# Altium footprint library TarabusLib_KOR.PcbLib: 560 footprints (part 34 of 35)
Each footprint in its own frame and in the unit in brackets; x right, y up, seen from the top. Pads: shape width x height; smd on the part's side, far side on the other; paste and mask are expansions set on the pad; w line width, h text height; cw(c..) or ccw(c..) is an arc to the next point about the centre after c.
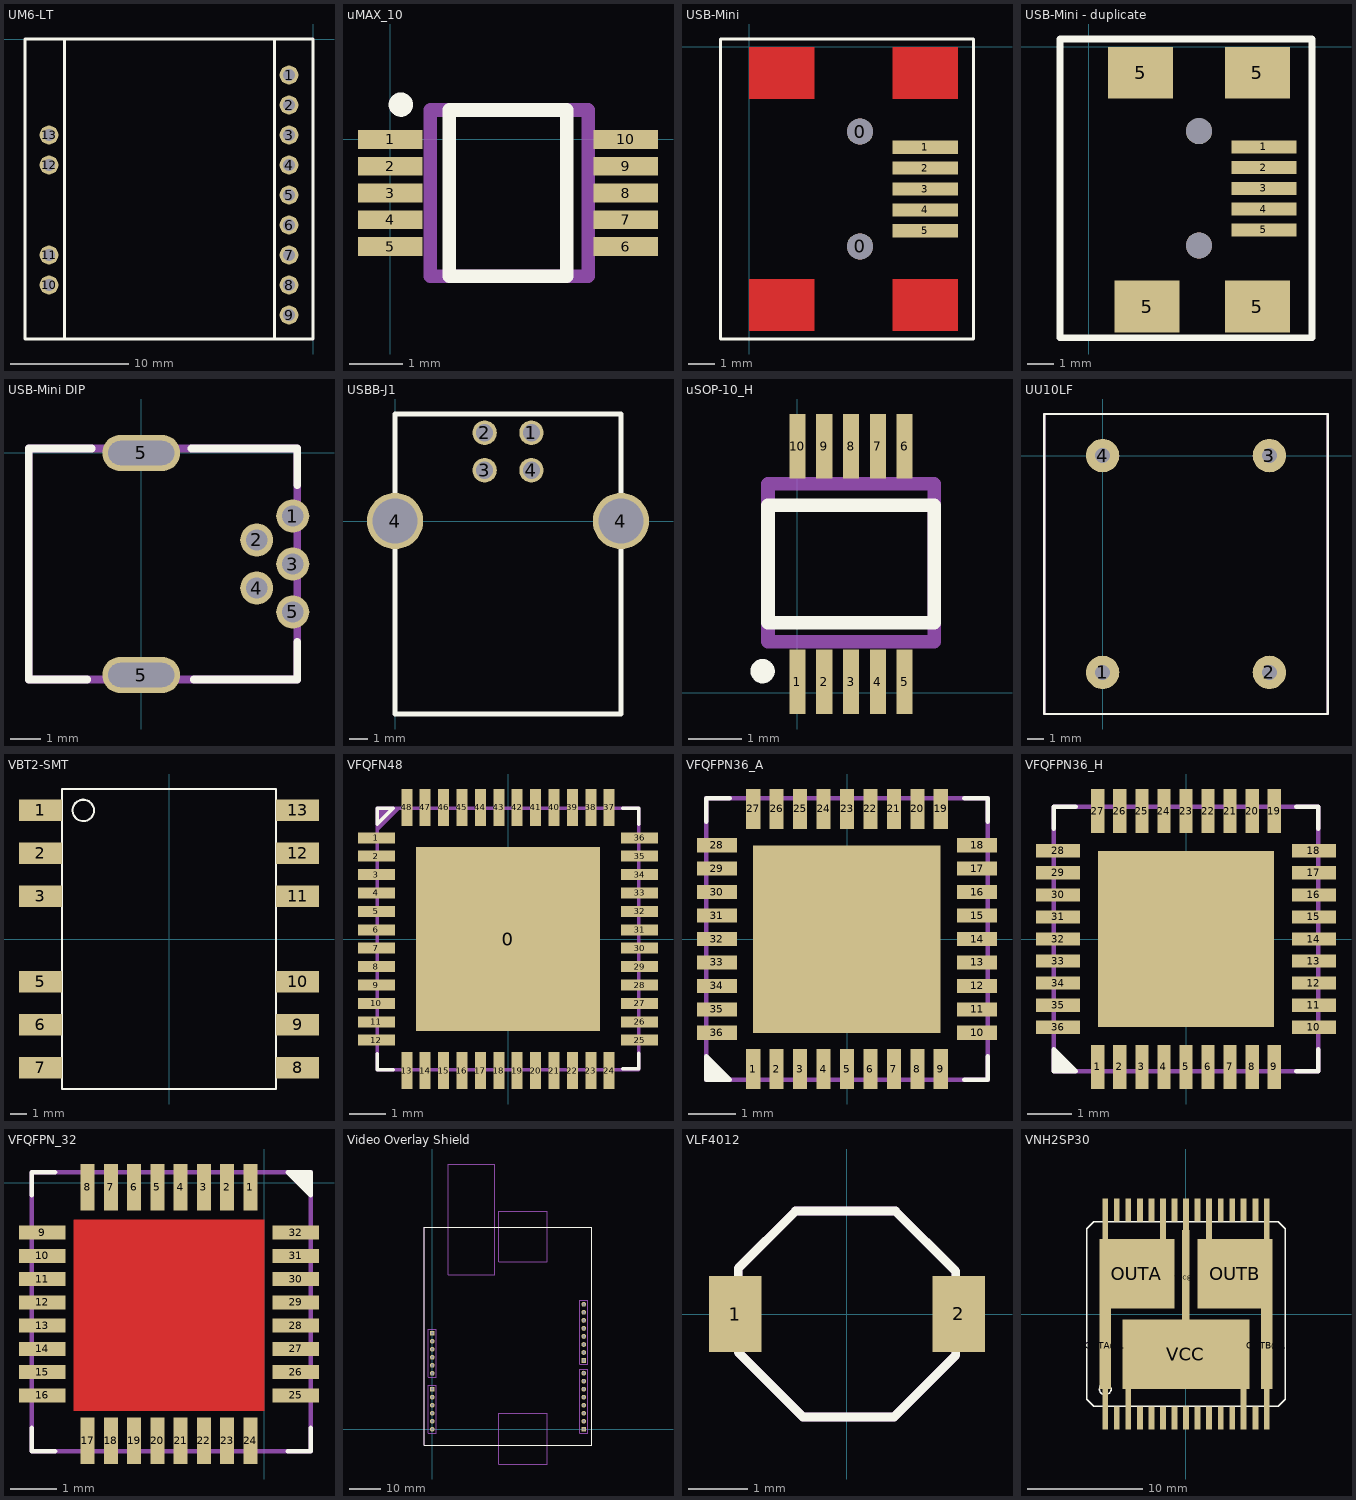
[diagram p33: the footprints below, top view; thin cyan lines are the x and y axes]

## UM6-LT [mm]
pads (13):
  round 1.6 hole 1 mask+0: 1(-2.032,-3.048) 2(-2.032,-5.588) 3(-2.032,-8.128) 4(-2.032,-10.668) 5(-2.032,-13.208) 6(-2.032,-15.748) 7(-2.032,-18.288) 8(-2.032,-20.828) 9(-2.032,-23.368) 10(-22.352,-20.828) 11(-22.352,-18.288) 12(-22.352,-10.668) 13(-22.352,-8.128)
Top Overlay:
  lines w0.254: -21.05,-25.4 -21.05,0 ; -3.27,-25.4 -3.27,0 ; -24.384,-25.4 0,-25.4 0,0 -24.384,0 -24.384,-25.4
3D body: height 8, standoff 2, extent -24.384,-25.4 0,0

## uMAX_10 [mm]
pads (10):
  rect 1.2x0.35 smd mask+0: 1(0,0) 2(0,-0.5) 3(0,-1) 4(0,-1.5) 5(0,-2) 6(4.4,-2) 7(4.4,-1.5) 8(4.4,-1) 9(4.4,-0.5) 10(4.4,0)
Top Overlay:
  circle w0.254: c0.2,0.65 r0.1
  lines w0.254: 1.1,-2.55 1.1,0.55 3.3,0.55 3.3,-2.55 1.1,-2.55
Mechanical 7:
  lines w0.254: 0.75,-2.55 0.75,0.55 ; 0.8,-2.55 3.7,-2.55 3.7,0.55 0.8,0.55
3D body "SW3dPS-uMAX10.STEP": height 0.95, standoff 0, extent -0.3,-2.5 4.7,0.5

## USB-Mini [mm]
pads (7):
  round 1 hole 1 mask+0: 0(4.25,-7.65) 0(4.25,-3.25)
  rect 2.5x0.5 smd: 1(6.75,-3.85) 2(6.75,-4.65) 3(6.75,-5.45) 4(6.75,-6.25) 5(6.75,-7.05)
Top Layer:
  rectangle: 0,-10.9 2.5,-8.9
  rectangle: 0,-2 2.5,0
  rectangle: 5.5,-10.9 8,-8.9
  rectangle: 5.5,-2 8,0
Top Overlay:
  lines w0.1: -1.1,-11.2 8.6,-11.2 8.6,0.3 -1.1,0.3 -1.1,-11.2
3D body "User Library-usb_mini_smd.STEP": height 4.14, standoff -0.95, extent -1.7,-10.4 7.5,-0.5

## USB-Mini - duplicate [mm]
height 2
pads (11):
  rect 2.5x0.5 smd: 1(6.75,-3.85) 2(6.75,-4.65) 3(6.75,-5.45) 4(6.75,-6.25) 5(6.75,-7.05)
  rect 2.5x2 smd: 5(2,-1) 5(2.25,-10) 5(6.5,-10) 5(6.5,-1)
  round 1 hole 1 mask+0: ""(4.25,-7.65)
  round 1 hole 1 unplated mask+0: ""(4.25,-3.25)
Top Overlay:
  lines w0.254: -1.1,-11.2 -1.1,0.3 8.6,0.3 8.6,-11.2 -1.1,-11.2
3D body "miniusbfm.step": height 3.9, standoff -0.05, extent -1.825,-10.45 7.175,-0.55

## USB-Mini DIP [mm]
height 3.9
pads (7):
  round 1.1 hole 0.7: 1(5.05,-2.1) 2(3.85,-2.9) 3(5.05,-3.7) 4(3.85,-4.5) 5(5.05,-5.3)
  oval 2.6x1.2 hole 0.8 slot 2.2 at 0 deg: 5(0,-7.4) 5(0,0)
Top Overlay:
  lines w0.254: -1.8,-7.55 -3.75,-7.55 -3.75,0.15 -1.65,0.15 ; 1.675,0.15 5.2,0.15 5.2,-1.075 ; 1.75,-7.55 5.2,-7.55 5.2,-6.3
Mechanical 7:
  lines w0.254: -3.75,-7.55 -3.75,0.15 5.2,0.15 5.2,-7.55 -3.75,-7.55
3D body: height 3.9, standoff 0, extent -3.749,-7.549 5.199,0.149

## USBB-J1 [mm]
pads (6):
  round 1.3 hole 0.92: 1(7.27,4.71) 2(4.77,4.71) 3(4.77,2.71) 4(7.27,2.71)
  round 3 hole 2.4: 4(0,0) 4(12.04,0)
Top Overlay:
  lines w0.254: 12,5.71 0,5.71 0,-10.29 12.04,-10.29 12.04,5.71
3D body "User Library-Samtec - USB-B-S-X-W-TH.STEP": height 11, standoff -3.64, extent -1.398,-10.3 13.398,6.2

## uSOP-10_H [mm]
pads (10):
  rect 0.3x1.2 smd mask+0: 1(0,0.2) 2(0.5,0.2) 3(1,0.2) 4(1.5,0.2) 5(2,0.2) 6(2,4.6) 7(1.5,4.6) 8(1,4.6) 9(0.5,4.6) 10(0,4.6)
Top Overlay:
  circle w0.254: c-0.65,0.4 r0.1
  lines w0.254: -0.55,1.3 2.55,1.3 2.55,3.5 -0.55,3.5 -0.55,1.3
Mechanical 9:
  text ".Comment" at 3.25,1 h0.6
  text ".Designator" at -1,1 h0.8
Mechanical 11:
  lines w0.254: -0.55,0.95 2.55,0.95 ; -0.55,1 -0.55,3.9 2.55,3.9 2.55,1
3D body "User Library-msop-10.STEP": height 1.15, standoff 0, extent -0.5,-0.05 2.5,4.85

## UU10LF [mm]
pads (4):
  round 2 hole 0.9: 1(0,-13) 2(10,-13) 3(10,0) 4(0,0)
Top Overlay:
  lines w0.15: -3.5,-15.5 -3.5,2.5 13.5,2.5 13.5,-15.5 -3.5,-15.5
Mechanical 7:
  lines w0.15: -3.5,-15.5 13.5,-15.5 13.5,2.5 -3.5,2.5 -3.5,-15.5
Mechanical 10:
  text ".Comment" at 9,3.5 h0.6
  text ".Designator" at 8.8,4.425 h0.8
3D body: height 23, standoff 0, extent -3.5,-15.5 13.5,2.5

## VBT2-SMT [mm]
pads (12):
  rect 2.54x1.27 smd: 1(-7.62,7.62) 2(-7.62,5.08) 3(-7.62,2.54) 5(-7.62,-2.54) 6(-7.62,-5.08) 7(-7.62,-7.62) 8(7.62,-7.62) 9(7.62,-5.08) 10(7.62,-2.54) 11(7.62,2.54) 12(7.62,5.08) 13(7.62,7.62)
Top Overlay:
  circle w0.127: c-5.08,7.62 r0.635
  lines w0.127: -6.35,-8.89 -6.35,8.89 6.35,8.89 6.35,-8.89 -6.35,-8.89

## VFQFN48 [mm]
height 1
pads (49):
  rect 5x5 smd: 0(0,0)
  rect 1x0.3 smd: 1(-3.575,2.75) 2(-3.575,2.25) 3(-3.575,1.75) 4(-3.575,1.25) 5(-3.575,0.75) 6(-3.575,0.25) 7(-3.575,-0.25) 8(-3.575,-0.75) 9(-3.575,-1.25) 10(-3.575,-1.75) 11(-3.575,-2.25) 12(-3.575,-2.75) 25(3.575,-2.75) 26(3.575,-2.25) 27(3.575,-1.75) 28(3.575,-1.25) 29(3.575,-0.75) 30(3.575,-0.25) 31(3.575,0.25) 32(3.575,0.75) 33(3.575,1.25) 34(3.575,1.75) 35(3.575,2.25) 36(3.575,2.75)
  rect 0.3x1 smd: 13(-2.75,-3.575) 14(-2.25,-3.575) 15(-1.75,-3.575) 16(-1.25,-3.575) 17(-0.75,-3.575) 18(-0.25,-3.575) 19(0.25,-3.575) 20(0.75,-3.575) 21(1.25,-3.575) 22(1.75,-3.575) 23(2.25,-3.575) 24(2.75,-3.575) 37(2.75,3.575) 38(2.25,3.575) 39(1.75,3.575) 40(1.25,3.575) 41(0.75,3.575) 42(0.25,3.575) 43(-0.25,3.575) 44(-0.75,3.575) 45(-1.25,3.575) 46(-1.75,3.575) 47(-2.25,3.575) 48(-2.75,3.575)
Top Overlay:
  lines w0.1: -3.55,-3.125 -3.55,-3.55 -3.125,-3.55 ; 3.125,-3.525 3.55,-3.525 3.55,-3.1 ; 3.125,3.55 3.55,3.55 3.55,3.125 ; -3.55,3.125 -3.125,3.55 -3.55,3.55 -3.55,3.125
Mechanical 9:
  text ".Designator" at -1.225,-4.925 h0.6
  text ".Comment" at -1.275,4.375 h0.6
Mechanical 11:
  lines w0.1: -3.546,2.979 -2.987,3.538 ; -3.542,3.108 -3.1,3.55 ; -3.542,3.208 -3.213,3.537 ; -3.542,3.396 -3.4,3.537 -3.375,3.512 ; -3.517,3.333 -3.338,3.512 ; -3.55,-3.55 3.55,-3.55 3.55,3.55 -3.55,3.55 -3.55,-3.55
3D body "UFQFPN48.STEP": height 0.55, standoff -0.02, extent -3.505,-3.5 3.505,3.51

## VFQFPN36_A [mm]
height 1
pads (37):
  rect 0.3x0.85 smd mask+0: 1(-2,-2.775) 2(-1.5,-2.775) 3(-1,-2.775) 4(-0.5,-2.775) 5(0,-2.775) 6(0.5,-2.775) 7(1,-2.775) 8(1.5,-2.775) 9(2,-2.775) 19(2,2.775) 20(1.5,2.775) 21(1,2.775) 22(0.5,2.775) 23(0,2.775) 24(-0.5,2.775) 25(-1,2.775) 26(-1.5,2.775) 27(-2,2.775)
  rect 0.85x0.3 smd mask+0: 10(2.775,-2) 11(2.775,-1.5) 12(2.775,-1) 13(2.775,-0.5) 14(2.775,0) 15(2.775,0.5) 16(2.775,1) 17(2.775,1.5) 18(2.775,2) 28(-2.775,2) 29(-2.775,1.5) 30(-2.775,1) 31(-2.775,0.5) 32(-2.775,0) 33(-2.775,-0.5) 34(-2.775,-1) 35(-2.775,-1.5) 36(-2.775,-2)
  rect 4x4 smd: ""(0,0)
Top Overlay:
  region: -3,-3 -2.5,-3 -3,-2.5
  lines w0.1: -3,2.5 -3,3 -2.5,3 ; 2.5,-3 3,-3 3,-2.5 ; 2.5,3 3,3 3,2.5 ; -3,-3 -2.5,-3 -3,-2.5 -3,-3
Mechanical 9:
  text ".Designator" at -1.075,3.6 h0.8
  text ".Comment" at -1,-3.875 h0.6
Mechanical 11:
  lines w0.1: -3,-3 -3,3 3,3 3,-3 -3,-3
3D body "VFQFPN36.STEP": height 0.9, standoff -0.02, extent -3.03,-3.005 2.98,3.005

## VFQFPN36_H [mm]
height 1
pads (37):
  rect 0.3x1 smd mask+0: 1(-2,-2.9) 2(-1.5,-2.9) 3(-1,-2.9) 4(-0.5,-2.9) 5(0,-2.9) 6(0.5,-2.9) 7(1,-2.9) 8(1.5,-2.9) 9(2,-2.9) 19(2,2.9) 20(1.5,2.9) 21(1,2.9) 22(0.5,2.9) 23(0,2.9) 24(-0.5,2.9) 25(-1,2.9) 26(-1.5,2.9) 27(-2,2.9)
  rect 1x0.3 smd mask+0: 10(2.9,-2) 11(2.9,-1.5) 12(2.9,-1) 13(2.9,-0.5) 14(2.9,0) 15(2.9,0.5) 16(2.9,1) 17(2.9,1.5) 18(2.9,2) 28(-2.9,2) 29(-2.9,1.5) 30(-2.9,1) 31(-2.9,0.5) 32(-2.9,0) 33(-2.9,-0.5) 34(-2.9,-1) 35(-2.9,-1.5) 36(-2.9,-2)
  rect 4x4 smd: ""(0,0)
Top Overlay:
  region: -3,-3 -2.5,-3 -3,-2.5
  lines w0.1: -3,2.5 -3,3 -2.5,3 ; 2.5,-3 3,-3 3,-2.5 ; 2.5,3 3,3 3,2.5 ; -3,-3 -3,-2.5 -2.5,-3 -3,-3
Mechanical 7:
  lines w0.1: -3,-3 3,-3 3,3 -3,3 -3,-3
Mechanical 10:
  text ".Comment" at -1,-3.875 h0.6
  text ".Designator" at -1.05,3.6 h0.8
3D body: height 1, standoff 0, extent -3,-3 3,3

## VFQFPN_32 [mm]
pads (32):
  rect 0.3x1 smd mask+0: 1(-0.3,-0.1) 2(-0.8,-0.1) 3(-1.3,-0.1) 4(-1.8,-0.1) 5(-2.3,-0.1) 6(-2.8,-0.1) 7(-3.3,-0.1) 8(-3.8,-0.1) 17(-3.8,-5.55) 18(-3.3,-5.55) 19(-2.8,-5.55) 20(-2.3,-5.55) 21(-1.8,-5.55) 22(-1.3,-5.55) 23(-0.8,-5.55) 24(-0.3,-5.55)
  rect 1x0.3 smd mask+0: 9(-4.775,-1.075) 10(-4.775,-1.575) 11(-4.775,-2.075) 12(-4.775,-2.575) 13(-4.775,-3.075) 14(-4.775,-3.575) 15(-4.775,-4.075) 16(-4.775,-4.575) 25(0.675,-4.575) 26(0.675,-4.075) 27(0.675,-3.575) 28(0.675,-3.075) 29(0.675,-2.575) 30(0.675,-2.075) 31(0.675,-1.575) 32(0.675,-1.075)
Top Layer:
  region: -4.1,-0.8 0,-0.8 0,-4.9 -4.1,-4.9
Top Overlay:
  region: 1,0.225 0.5,0.225 1,-0.275
  lines w0.1: -5,-5.275 -5,-5.775 -4.5,-5.775 ; -5,-0.275 -5,0.225 -4.5,0.225 ; 0.5,-5.775 1,-5.775 1,-5.275 ; 0.5,0.225 1,-0.275 1,0.225 0.5,0.225
Mechanical 7:
  lines w0.1: -5,-5.775 -5,0.225 1,0.225 1,-5.775 -5,-5.775
Mechanical 10:
  text ".Designator" at -3.302,0.762 h0.6
  text ".Comment" at -3.302,-6.604 h0.6
3D body: height 1, standoff 0, extent -4.55,-5.275 0.45,-0.275

## Video Overlay Shield [mm]
pads (28):
  rect 1.5x1.5 hole 0.9: 1(0,30.4) 7(0,12.7) 13(48,0) 21(48,21.775)
  round 1.5 hole 0.9: 2(0,27.86) 3(0,25.32) 4(0,22.78) 5(0,20.24) 6(0,17.7) 8(0,10.16) 9(0,7.62) 10(0,5.08) 11(0,2.54) 12(0,0) 14(48,2.54) 15(48,5.08) 16(48,7.62) 17(48,10.16) 18(48,12.7) 19(48,15.24) 20(48,17.78) 22(48,24.315) 23(48,26.855) 24(48,29.395) 25(48,31.935) 26(48,34.475) 27(48,37.015) 28(48,39.555)
Top Overlay:
  lines w0.15: -2.5,-5 -2.5,64 50.5,64 50.5,-5 -2.5,-5
Mechanical 7:
  lines w0.1: -2.5,-5 50.5,-5 50.5,64 -2.5,64 -2.5,-5 ; -1.3,-1.2 -1.3,14 1.3,14 1.3,-1.2 -1.3,-1.2 ; -1.3,16.5 1.3,16.5 1.3,31.7 -1.3,31.7 -1.3,16.5 ; 5,49 5,84 19.8,84 19.8,49 5,49 ; 21,-11 36.5,-11 36.5,5 21,5 21,-11 ; 21,53 21,69 36.5,69 36.5,53 21,53 ; 46.7,-1.2 46.7,19 49.3,19 49.3,-1.2 46.7,-1.2 ; 46.7,20.575 46.7,40.9 49.3,40.9 49.3,20.575 46.7,20.575
3D body: height 16, standoff 3, extent 4.9,49 19.8,84
3D body: height 15, standoff 3, extent 20.9,52.9 36.5,69
3D body: height 15, standoff 3, extent 21,-11 36.5,5
3D body: height 3, standoff 1.5, extent -2.5,-5 50.5,64
3D body: height 11, standoff 3, extent -1.3,16.5 1.3,31.7
3D body: height 11, standoff 3, extent -1.3,-1.2 1.3,14
3D body: height 11, standoff 3, extent 46.7,-1.2 49.3,19
3D body: height 11, standoff 3, extent 46.7,20.575 49.3,40.9

## VLF4012 [mm]
height 3.5
pads (2):
  rect 0.9x1.3 smd: 1(-1.9,0) 2(1.9,0)
Top Overlay:
  lines w0.15: -1.85,-0.65 -0.75,-1.75 0.8,-1.75 1.85,-0.7 1.85,0.725 0.825,1.75 -0.875,1.75 -1.85,0.775 -1.85,-0.65
Mechanical 7:
  lines w0.15: -1.85,-0.65 -1.85,0.775 -0.875,1.75 0.825,1.75 1.85,0.725 1.85,-0.7 0.8,-1.75 -0.75,-1.75 -1.85,-0.65
3D body: height 1.2, standoff 0, extent -1.925,-1.825 1.95,1.825

## VNH2SP30 [mil]
pads (36):
  rect 20x473 smd: 1(-275.59,-157.48) 15(276,-157.48) 16(276,158) 30(-275.59,158)
  rect 20x79 smd: 2(-236.22,-354.33) 4(-157.48,-354.33) 5(-118.11,-354.33) 6(-78.74,-354.33) 7(-39.37,-354.33) 8(0,-354.33) 9(40,-354.33) 10(79,-354.33) 11(119,-354.33) 12(158,-354.33) 14(237,-354.33) 17(237,355) 18(197,355) 19(158,355) 20(119,355) 22(40,355) 24(-39.37,355) 26(-118.11,355) 27(-157.48,355) 28(-196.85,355) 29(-236.22,355)
  rect 20x158 smd: 3(-196.85,-314.96) 13(197,-314.96) 21(79,315) 23(0,315) 25(-78.74,315)
  rect 256x237 smd: OUTA(-167.32,138) OUTB(168,138)
  rect 40x296 smd: OUTA@1(-275.59,-108.46) OUTB@1(276,-108.46)
  rect 434x237 smd: VCC(0,-137.8)
  rect 26x327 smd: VCC@1(0,124)
Top Overlay:
  circle w5: c-275.59,-255.91 r20
  lines w5: -338.58,-291.34 -338.58,292 -314.96,315 315,315 339,292 339,-291.34 315,-314.96 -314.96,-314.96 -338.58,-291.34
Top Paste:
  circle w0: c158,-216.54 r12
  circle w0: c79,-216.54 r12
  circle w0: c0,-216.54 r12
  circle w0: c-78.74,-216.54 r12
  circle w0: c-157.48,-216.54 r12
  circle w0: c158,-137.8 r12
  circle w0: c79,-137.8 r12
  circle w0: c0,-137.8 r12
  circle w0: c-78.74,-137.8 r12
  circle w0: c-157.48,-137.8 r12
  circle w0: c158,-59.06 r12
  circle w0: c79,-59.06 r12
  circle w0: c0,-59.06 r12
  circle w0: c-78.74,-59.06 r12
  circle w0: c-157.48,-59.06 r12
  circle w0: c237,60 r12
  circle w0: c158,60 r12
  circle w0: c79,60 r12
  circle w0: c-78.74,60 r12
  circle w0: c-157.48,60 r12
  circle w0: c-236.22,60 r12
  circle w0: c237,138 r12
  circle w0: c158,138 r12
  circle w0: c79,138 r12
  circle w0: c-78.74,138 r12
  circle w0: c-157.48,138 r12
  circle w0: c-236.22,138 r12
  circle w0: c237,217 r12
  circle w0: c158,217 r12
  circle w0: c79,217 r12
  circle w0: c-78.74,217 r12
  circle w0: c-157.48,217 r12
  circle w0: c-236.22,217 r12
  region: 286,-314.76 266,-314.76 266,-393.5 286,-393.5
  region: 207,-314.76 188,-314.76 188,-393.5 207,-393.5
  region: -187.01,-314.76 -206.69,-314.76 -206.69,-393.5 -187.01,-393.5
  region: -265.75,-314.76 -285.43,-314.76 -285.43,-393.5 -265.75,-393.5
  rectangle: 266,315 286,394
  rectangle: 69,315 89,394
  rectangle: -9.84,315 10,394
  rectangle: -88.58,315 -68.9,394
  rectangle: -285.43,315 -265.75,394
Top Solder:
  circle w0: c158,-216.54 r16
  circle w0: c79,-216.54 r16
  circle w0: c0,-216.54 r16
  circle w0: c-78.74,-216.54 r16
  circle w0: c-157.48,-216.54 r16
  circle w0: c158,-137.8 r16
  circle w0: c79,-137.8 r16
  circle w0: c0,-137.8 r16
  circle w0: c-78.74,-137.8 r16
  circle w0: c-157.48,-137.8 r16
  circle w0: c158,-59.06 r16
  circle w0: c79,-59.06 r16
  circle w0: c0,-59.06 r16
  circle w0: c-78.74,-59.06 r16
  circle w0: c-157.48,-59.06 r16
  circle w0: c237,60 r16
  circle w0: c158,60 r16
  circle w0: c79,60 r16
  circle w0: c-78.74,60 r16
  circle w0: c-157.48,60 r16
  circle w0: c-236.22,60 r16
  circle w0: c237,138 r16
  circle w0: c158,138 r16
  circle w0: c79,138 r16
  circle w0: c-78.74,138 r16
  circle w0: c-157.48,138 r16
  circle w0: c-236.22,138 r16
  circle w0: c237,217 r16
  circle w0: c158,217 r16
  circle w0: c79,217 r16
  circle w0: c-78.74,217 r16
  circle w0: c-157.48,217 r16
  circle w0: c-236.22,217 r16
  region: 290,-310.83 262,-310.83 262,-397.44 290,-397.44
  region: 211,-310.83 184,-310.83 184,-397.44 211,-397.44
  region: -183.07,-310.83 -210.63,-310.83 -210.63,-397.44 -183.07,-397.44
  region: -261.81,-310.83 -289.37,-310.83 -289.37,-397.44 -261.81,-397.44
  rectangle: 262,311 290,398
  rectangle: 65,311 93,398
  rectangle: -13.78,311 14,398
  rectangle: -92.52,311 -64.96,398
  rectangle: -289.37,311 -261.81,398